# Altium schematic symbol library jlcpcb_2025_04_capacitors_extended_1206.schlib: 2503 symbols (part 14 of 14)
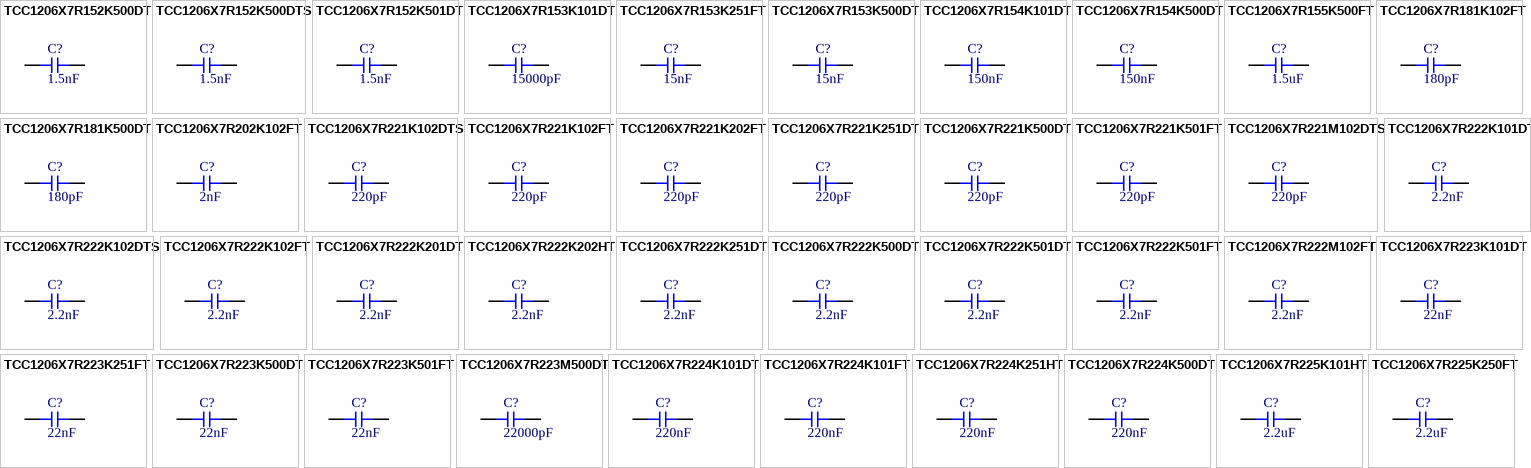
[diagram p75: symbols TCC1206X7R152K500DT to TCC1206X7R225K250FT]

## TCC1206X7R222K251DT
designator C?  Capacitance: 2.2nF  (hidden comment: *)
Capacitor, Ceramic (MLCC), 2.2nF, ±10%, 250V, X7R, ±10%, SMD 1206; Manufacturer: CCTC; Manufacturer Part Number: TCC1206X7R222K251DT; Package Size: 1206; JLCPCB Basic Part: No; JLCPCB Part Number: C377084; Supplier 1: LCSC; Category: Capacitors - MLCC; Supplier Part Number 1: C377084; Tolerance: ±10%; Voltage Rating: 250V; Temperature Coefficient: X7R; RoHS: Yes; ComponentLink1Description: Datasheet; ComponentLink1URL: https://wmsc.lcsc.com/wmsc/upload/file/pdf/v2/lcsc/2304140030_CCTC-TCC1206X7R222K251DT_C377084.pdf; ComponentLink2Description: JLCPCB Part URL; ComponentLink2URL: https://jlcpcb.com/partdetail/C377084; ComponentLink3Description: LCSC Part URL; ComponentLink3URL: https://lcsc.com/product-detail/Multilayer-Ceramic-Capacitors-MLCC---SMD-SMT_CCTC-CCTC-TCC1206X7R222K251DT_C377084.html
footprint CAP-1206 (1206 (3216M) Capacitor)
pins: 1, 2

## TCC1206X7R222K500DT
designator C?  Capacitance: 2.2nF  (hidden comment: *)
Capacitor, Ceramic (MLCC), 2.2nF, ±10%, 50V, X7R, ±10%, SMD 1206; Manufacturer: CCTC; Manufacturer Part Number: TCC1206X7R222K500DT; Package Size: 1206; JLCPCB Basic Part: No; JLCPCB Part Number: C282847; Supplier 1: LCSC; Category: Capacitors - MLCC; Supplier Part Number 1: C282847; Tolerance: ±10%; Voltage Rating: 50V; Temperature Coefficient: X7R; RoHS: Yes; ComponentLink1Description: Datasheet; ComponentLink1URL: https://wmsc.lcsc.com/wmsc/upload/file/pdf/v2/lcsc/2304140030_CCTC-TCC1206X7R222K500DT_C282847.pdf; ComponentLink2Description: JLCPCB Part URL; ComponentLink2URL: https://jlcpcb.com/partdetail/C282847; ComponentLink3Description: LCSC Part URL; ComponentLink3URL: https://lcsc.com/product-detail/Multilayer-Ceramic-Capacitors-MLCC---SMD-SMT_CCTC-CCTC-TCC1206X7R222K500DT_C282847.html
footprint CAP-1206 (1206 (3216M) Capacitor)
pins: 1, 2

## TCC1206X7R222K501DT
designator C?  Capacitance: 2.2nF  (hidden comment: *)
Capacitor, Ceramic (MLCC), 2.2nF, ±10%, 500V, X7R, ±10%, SMD 1206; Manufacturer: CCTC; Manufacturer Part Number: TCC1206X7R222K501DT; Package Size: 1206; JLCPCB Basic Part: No; JLCPCB Part Number: C309044; Supplier 1: LCSC; Category: Capacitors - MLCC; Supplier Part Number 1: C309044; Tolerance: ±10%; Voltage Rating: 500V; Temperature Coefficient: X7R; RoHS: Yes; ComponentLink1Description: Datasheet; ComponentLink1URL: https://wmsc.lcsc.com/wmsc/upload/file/pdf/v2/lcsc/2304140030_CCTC-TCC1206X7R222K501DT_C309044.pdf; ComponentLink2Description: JLCPCB Part URL; ComponentLink2URL: https://jlcpcb.com/partdetail/C309044; ComponentLink3Description: LCSC Part URL; ComponentLink3URL: https://lcsc.com/product-detail/Multilayer-Ceramic-Capacitors-MLCC---SMD-SMT_CCTC-CCTC-TCC1206X7R222K501DT_C309044.html
footprint CAP-1206 (1206 (3216M) Capacitor)
pins: 1, 2

## TCC1206X7R222K501FT
designator C?  Capacitance: 2.2nF  (hidden comment: *)
Capacitor, Ceramic (MLCC), 2.2nF, ±10%, 500V, X7R, ±10%, SMD 1206; Manufacturer: CCTC; Manufacturer Part Number: TCC1206X7R222K501FT; Package Size: 1206; JLCPCB Basic Part: No; JLCPCB Part Number: C377086; Supplier 1: LCSC; Category: Capacitors - MLCC; Supplier Part Number 1: C377086; Tolerance: ±10%; Voltage Rating: 500V; Temperature Coefficient: X7R; RoHS: Yes; ComponentLink1Description: Datasheet; ComponentLink1URL: https://wmsc.lcsc.com/wmsc/upload/file/pdf/v2/lcsc/2304140030_CCTC-TCC1206X7R222K501FT_C377086.pdf; ComponentLink2Description: JLCPCB Part URL; ComponentLink2URL: https://jlcpcb.com/partdetail/C377086; ComponentLink3Description: LCSC Part URL; ComponentLink3URL: https://lcsc.com/product-detail/Multilayer-Ceramic-Capacitors-MLCC---SMD-SMT_CCTC-CCTC-TCC1206X7R222K501FT_C377086.html
footprint CAP-1206 (1206 (3216M) Capacitor)
pins: 1, 2

## TCC1206X7R222M102FT
designator C?  Capacitance: 2.2nF  (hidden comment: *)
Capacitor, Ceramic (MLCC), 2.2nF, ±20%, 1kV, X7R, ±20%, SMD 1206; Manufacturer: CCTC; Manufacturer Part Number: TCC1206X7R222M102FT; Package Size: 1206; JLCPCB Basic Part: No; JLCPCB Part Number: C5448912; Supplier 1: LCSC; Category: Capacitors - MLCC; Supplier Part Number 1: C5448912; Tolerance: ±20%; Voltage Rating: 1kV; Temperature Coefficient: X7R; RoHS: Yes; ComponentLink1Description: Datasheet; ComponentLink1URL: https://wmsc.lcsc.com/wmsc/upload/file/pdf/v2/lcsc/2304251417_CCTC-TCC1206X7R222M102FT_C5448912.pdf; ComponentLink2Description: JLCPCB Part URL; ComponentLink2URL: https://jlcpcb.com/partdetail/C5448912; ComponentLink3Description: LCSC Part URL; ComponentLink3URL: https://lcsc.com/product-detail/Multilayer-Ceramic-Capacitors-MLCC---SMD-SMT_CCTC-CCTC-TCC1206X7R222M102FT_C5448912.html
footprint CAP-1206 (1206 (3216M) Capacitor)
pins: 1, 2

## TCC1206X7R223K101DT
designator C?  Capacitance: 22nF  (hidden comment: *)
Capacitor, Ceramic (MLCC), 22nF, ±10%, 100V, X7R, ±10%, SMD 1206; Manufacturer: CCTC; Manufacturer Part Number: TCC1206X7R223K101DT; Package Size: 1206; JLCPCB Basic Part: No; JLCPCB Part Number: C282848; Supplier 1: LCSC; Category: Capacitors - MLCC; Supplier Part Number 1: C282848; Tolerance: ±10%; Voltage Rating: 100V; Temperature Coefficient: X7R; RoHS: Yes; ComponentLink1Description: Datasheet; ComponentLink1URL: https://wmsc.lcsc.com/wmsc/upload/file/pdf/v2/lcsc/2304140030_CCTC-TCC1206X7R223K101DT_C282848.pdf; ComponentLink2Description: JLCPCB Part URL; ComponentLink2URL: https://jlcpcb.com/partdetail/C282848; ComponentLink3Description: LCSC Part URL; ComponentLink3URL: https://lcsc.com/product-detail/Multilayer-Ceramic-Capacitors-MLCC---SMD-SMT_CCTC-CCTC-TCC1206X7R223K101DT_C282848.html
footprint CAP-1206 (1206 (3216M) Capacitor)
pins: 1, 2

## TCC1206X7R223K251FT
designator C?  Capacitance: 22nF  (hidden comment: *)
Capacitor, Ceramic (MLCC), 22nF, ±10%, 250V, X7R, ±10%, SMD 1206; Manufacturer: CCTC; Manufacturer Part Number: TCC1206X7R223K251FT; Package Size: 1206; JLCPCB Basic Part: No; JLCPCB Part Number: C282849; Supplier 1: LCSC; Category: Capacitors - MLCC; Supplier Part Number 1: C282849; Tolerance: ±10%; Voltage Rating: 250V; Temperature Coefficient: X7R; RoHS: Yes; ComponentLink1Description: Datasheet; ComponentLink1URL: https://wmsc.lcsc.com/wmsc/upload/file/pdf/v2/lcsc/2304140030_CCTC-TCC1206X7R223K251FT_C282849.pdf; ComponentLink2Description: JLCPCB Part URL; ComponentLink2URL: https://jlcpcb.com/partdetail/C282849; ComponentLink3Description: LCSC Part URL; ComponentLink3URL: https://lcsc.com/product-detail/Multilayer-Ceramic-Capacitors-MLCC---SMD-SMT_CCTC-CCTC-TCC1206X7R223K251FT_C282849.html
footprint CAP-1206 (1206 (3216M) Capacitor)
pins: 1, 2

## TCC1206X7R223K500DT
designator C?  Capacitance: 22nF  (hidden comment: *)
Capacitor, Ceramic (MLCC), 22nF, ±10%, 50V, X7R, ±10%, SMD 1206; Manufacturer: CCTC; Manufacturer Part Number: TCC1206X7R223K500DT; Package Size: 1206; JLCPCB Basic Part: No; JLCPCB Part Number: C282850; Supplier 1: LCSC; Category: Capacitors - MLCC; Supplier Part Number 1: C282850; Tolerance: ±10%; Voltage Rating: 50V; Temperature Coefficient: X7R; RoHS: Yes; ComponentLink1Description: Datasheet; ComponentLink1URL: https://wmsc.lcsc.com/wmsc/upload/file/pdf/v2/lcsc/2304140030_CCTC-TCC1206X7R223K500DT_C282850.pdf; ComponentLink2Description: JLCPCB Part URL; ComponentLink2URL: https://jlcpcb.com/partdetail/C282850; ComponentLink3Description: LCSC Part URL; ComponentLink3URL: https://lcsc.com/product-detail/Multilayer-Ceramic-Capacitors-MLCC---SMD-SMT_CCTC-CCTC-TCC1206X7R223K500DT_C282850.html
footprint CAP-1206 (1206 (3216M) Capacitor)
pins: 1, 2

## TCC1206X7R223K501FT
designator C?  Capacitance: 22nF  (hidden comment: *)
Capacitor, Ceramic (MLCC), 22nF, ±10%, 500V, X7R, ±10%, SMD 1206; Manufacturer: CCTC; Manufacturer Part Number: TCC1206X7R223K501FT; Package Size: 1206; JLCPCB Basic Part: No; JLCPCB Part Number: C282851; Supplier 1: LCSC; Category: Capacitors - MLCC; Supplier Part Number 1: C282851; Tolerance: ±10%; Voltage Rating: 500V; Temperature Coefficient: X7R; RoHS: Yes; ComponentLink1Description: Datasheet; ComponentLink1URL: https://wmsc.lcsc.com/wmsc/upload/file/pdf/v2/lcsc/2304140030_CCTC-TCC1206X7R223K501FT_C282851.pdf; ComponentLink2Description: JLCPCB Part URL; ComponentLink2URL: https://jlcpcb.com/partdetail/C282851; ComponentLink3Description: LCSC Part URL; ComponentLink3URL: https://lcsc.com/product-detail/Multilayer-Ceramic-Capacitors-MLCC---SMD-SMT_CCTC-CCTC-TCC1206X7R223K501FT_C282851.html
footprint CAP-1206 (1206 (3216M) Capacitor)
pins: 1, 2

## TCC1206X7R223M500DT
designator C?  Capacitance: 22000pF  (hidden comment: *)
Capacitor, Ceramic (MLCC), 22000pF, ±20%, 50V, X7R, ±20%, SMD 1206; Manufacturer: CCTC; Manufacturer Part Number: TCC1206X7R223M500DT; Package Size: 1206; JLCPCB Basic Part: No; JLCPCB Part Number: C915857; Supplier 1: LCSC; Category: Capacitors - MLCC; Supplier Part Number 1: C915857; Tolerance: ±20%; Voltage Rating: 50V; Temperature Coefficient: X7R; RoHS: Yes; ComponentLink1Description: Datasheet; ComponentLink1URL: https://wmsc.lcsc.com/wmsc/upload/file/pdf/v2/lcsc/2304140030_CCTC-TCC1206X7R223M500DT_C915857.pdf; ComponentLink2Description: JLCPCB Part URL; ComponentLink2URL: https://jlcpcb.com/partdetail/C915857; ComponentLink3Description: LCSC Part URL; ComponentLink3URL: https://lcsc.com/product-detail/Multilayer-Ceramic-Capacitors-MLCC---SMD-SMT_CCTC-CCTC-TCC1206X7R223M500DT_C915857.html
footprint CAP-1206 (1206 (3216M) Capacitor)
pins: 1, 2

## TCC1206X7R224K101DT
designator C?  Capacitance: 220nF  (hidden comment: *)
Capacitor, Ceramic (MLCC), 220nF, ±10%, 100V, X7R, ±10%, SMD 1206; Manufacturer: CCTC; Manufacturer Part Number: TCC1206X7R224K101DT; Package Size: 1206; JLCPCB Basic Part: No; JLCPCB Part Number: C377088; Supplier 1: LCSC; Category: Capacitors - MLCC; Supplier Part Number 1: C377088; Tolerance: ±10%; Voltage Rating: 100V; Temperature Coefficient: X7R; RoHS: Yes; ComponentLink1Description: Datasheet; ComponentLink1URL: https://wmsc.lcsc.com/wmsc/upload/file/pdf/v2/lcsc/2304140030_CCTC-TCC1206X7R224K101DT_C377088.pdf; ComponentLink2Description: JLCPCB Part URL; ComponentLink2URL: https://jlcpcb.com/partdetail/C377088; ComponentLink3Description: LCSC Part URL; ComponentLink3URL: https://lcsc.com/product-detail/Multilayer-Ceramic-Capacitors-MLCC---SMD-SMT_CCTC-CCTC-TCC1206X7R224K101DT_C377088.html
footprint CAP-1206 (1206 (3216M) Capacitor)
pins: 1, 2

## TCC1206X7R224K101FT
designator C?  Capacitance: 220nF  (hidden comment: *)
Capacitor, Ceramic (MLCC), 220nF, ±10%, 100V, X7R, ±10%, SMD 1206; Manufacturer: CCTC; Manufacturer Part Number: TCC1206X7R224K101FT; Package Size: 1206; JLCPCB Basic Part: No; JLCPCB Part Number: C374077; Supplier 1: LCSC; Category: Capacitors - MLCC; Supplier Part Number 1: C374077; Tolerance: ±10%; Voltage Rating: 100V; Temperature Coefficient: X7R; RoHS: Yes; ComponentLink1Description: Datasheet; ComponentLink1URL: https://wmsc.lcsc.com/wmsc/upload/file/pdf/v2/lcsc/2304140030_CCTC-TCC1206X7R224K101FT_C374077.pdf; ComponentLink2Description: JLCPCB Part URL; ComponentLink2URL: https://jlcpcb.com/partdetail/C374077; ComponentLink3Description: LCSC Part URL; ComponentLink3URL: https://lcsc.com/product-detail/Multilayer-Ceramic-Capacitors-MLCC---SMD-SMT_CCTC-CCTC-TCC1206X7R224K101FT_C374077.html
footprint CAP-1206 (1206 (3216M) Capacitor)
pins: 1, 2

## TCC1206X7R224K251HT
designator C?  Capacitance: 220nF  (hidden comment: *)
Capacitor, Ceramic (MLCC), 220nF, ±10%, 250V, X7R, ±10%, SMD 1206; Manufacturer: CCTC; Manufacturer Part Number: TCC1206X7R224K251HT; Package Size: 1206; JLCPCB Basic Part: No; JLCPCB Part Number: C377089; Supplier 1: LCSC; Category: Capacitors - MLCC; Supplier Part Number 1: C377089; Tolerance: ±10%; Voltage Rating: 250V; Temperature Coefficient: X7R; RoHS: Yes; ComponentLink1Description: Datasheet; ComponentLink1URL: https://wmsc.lcsc.com/wmsc/upload/file/pdf/v2/lcsc/2304140030_CCTC-TCC1206X7R224K251HT_C377089.pdf; ComponentLink2Description: JLCPCB Part URL; ComponentLink2URL: https://jlcpcb.com/partdetail/C377089; ComponentLink3Description: LCSC Part URL; ComponentLink3URL: https://lcsc.com/product-detail/Multilayer-Ceramic-Capacitors-MLCC---SMD-SMT_CCTC-CCTC-TCC1206X7R224K251HT_C377089.html
footprint CAP-1206 (1206 (3216M) Capacitor)
pins: 1, 2

## TCC1206X7R224K500DT
designator C?  Capacitance: 220nF  (hidden comment: *)
Capacitor, Ceramic (MLCC), 220nF, ±10%, 50V, X7R, ±10%, SMD 1206; Manufacturer: CCTC; Manufacturer Part Number: TCC1206X7R224K500DT; Package Size: 1206; JLCPCB Basic Part: No; JLCPCB Part Number: C377090; Supplier 1: LCSC; Category: Capacitors - MLCC; Supplier Part Number 1: C377090; Tolerance: ±10%; Voltage Rating: 50V; Temperature Coefficient: X7R; RoHS: Yes; ComponentLink1Description: Datasheet; ComponentLink1URL: https://wmsc.lcsc.com/wmsc/upload/file/pdf/v2/lcsc/2304140030_CCTC-TCC1206X7R224K500DT_C377090.pdf; ComponentLink2Description: JLCPCB Part URL; ComponentLink2URL: https://jlcpcb.com/partdetail/C377090; ComponentLink3Description: LCSC Part URL; ComponentLink3URL: https://lcsc.com/product-detail/Multilayer-Ceramic-Capacitors-MLCC---SMD-SMT_CCTC-CCTC-TCC1206X7R224K500DT_C377090.html
footprint CAP-1206 (1206 (3216M) Capacitor)
pins: 1, 2

## TCC1206X7R225K101HT
designator C?  Capacitance: 2.2uF  (hidden comment: *)
Capacitor, Ceramic (MLCC), 2.2uF, ±10%, 100V, X7R, ±10%, SMD 1206; Manufacturer: CCTC; Manufacturer Part Number: TCC1206X7R225K101HT; Package Size: 1206; JLCPCB Basic Part: No; JLCPCB Part Number: C7393990; Supplier 1: LCSC; Category: Capacitors - MLCC; Supplier Part Number 1: C7393990; Tolerance: ±10%; Voltage Rating: 100V; Temperature Coefficient: X7R; RoHS: Yes; ComponentLink1Description: Datasheet; ComponentLink1URL: https://wmsc.lcsc.com/wmsc/upload/file/pdf/v2/lcsc/2306211528_CCTC-TCC1206X7R225K101HT_C7393990.pdf; ComponentLink2Description: JLCPCB Part URL; ComponentLink2URL: https://jlcpcb.com/partdetail/C7393990; ComponentLink3Description: LCSC Part URL; ComponentLink3URL: https://lcsc.com/product-detail/Multilayer-Ceramic-Capacitors-MLCC---SMD-SMT_CCTC-CCTC-TCC1206X7R225K101HT_C7393990.html
footprint CAP-1206 (1206 (3216M) Capacitor)
pins: 1, 2

## TCC1206X7R225K250FT
designator C?  Capacitance: 2.2uF  (hidden comment: *)
Capacitor, Ceramic (MLCC), 2.2uF, ±10%, 25V, X7R, ±10%, SMD 1206; Manufacturer: CCTC; Manufacturer Part Number: TCC1206X7R225K250FT; Package Size: 1206; JLCPCB Basic Part: No; JLCPCB Part Number: C696854; Supplier 1: LCSC; Category: Capacitors - MLCC; Supplier Part Number 1: C696854; Tolerance: ±10%; Voltage Rating: 25V; Temperature Coefficient: X7R; RoHS: Yes; ComponentLink1Description: Datasheet; ComponentLink1URL: https://wmsc.lcsc.com/wmsc/upload/file/pdf/v2/lcsc/2304140030_CCTC-TCC1206X7R225K250FT_C696854.pdf; ComponentLink2Description: JLCPCB Part URL; ComponentLink2URL: https://jlcpcb.com/partdetail/C696854; ComponentLink3Description: LCSC Part URL; ComponentLink3URL: https://lcsc.com/product-detail/Multilayer-Ceramic-Capacitors-MLCC---SMD-SMT_CCTC-CCTC-TCC1206X7R225K250FT_C696854.html
footprint CAP-1206 (1206 (3216M) Capacitor)
pins: 1, 2

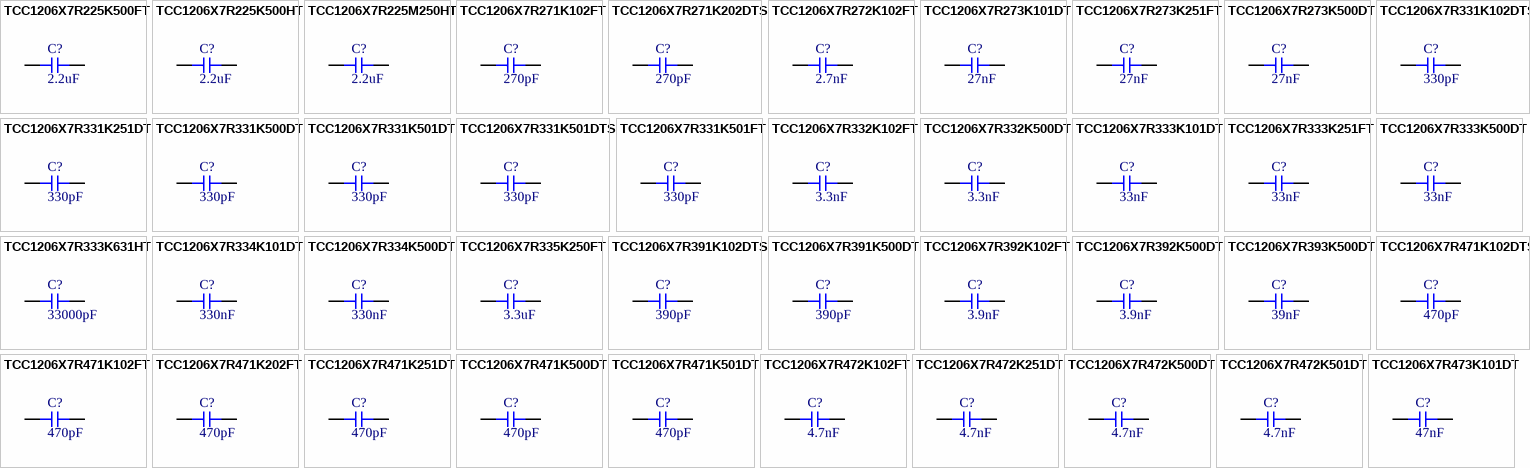
[diagram p60: symbols TCC1206X7R225K500FT to TCC1206X7R473K101DT]

## TCC1206X7R225K500FT
designator C?  Capacitance: 2.2uF  (hidden comment: *)
Capacitor, Ceramic (MLCC), 2.2uF, ±10%, 50V, X7R, ±10%, SMD 1206; Manufacturer: CCTC; Manufacturer Part Number: TCC1206X7R225K500FT; Package Size: 1206; JLCPCB Basic Part: No; JLCPCB Part Number: C282852; Supplier 1: LCSC; Category: Capacitors - MLCC; Supplier Part Number 1: C282852; Tolerance: ±10%; Voltage Rating: 50V; Temperature Coefficient: X7R; RoHS: Yes; ComponentLink1Description: Datasheet; ComponentLink1URL: https://wmsc.lcsc.com/wmsc/upload/file/pdf/v2/lcsc/2304140030_CCTC-TCC1206X7R225K500FT_C282852.pdf; ComponentLink2Description: JLCPCB Part URL; ComponentLink2URL: https://jlcpcb.com/partdetail/C282852; ComponentLink3Description: LCSC Part URL; ComponentLink3URL: https://lcsc.com/product-detail/Multilayer-Ceramic-Capacitors-MLCC---SMD-SMT_CCTC-CCTC-TCC1206X7R225K500FT_C282852.html
footprint CAP-1206 (1206 (3216M) Capacitor)
pins: 1, 2

## TCC1206X7R225K500HT
designator C?  Capacitance: 2.2uF  (hidden comment: *)
Capacitor, Ceramic (MLCC), 2.2uF, ±10%, 50V, X7R, ±10%, SMD 1206; Manufacturer: CCTC; Manufacturer Part Number: TCC1206X7R225K500HT; Package Size: 1206; JLCPCB Basic Part: No; JLCPCB Part Number: C2903669; Supplier 1: LCSC; Category: Capacitors - MLCC; Supplier Part Number 1: C2903669; Tolerance: ±10%; Voltage Rating: 50V; Temperature Coefficient: X7R; RoHS: Yes; ComponentLink1Description: Datasheet; ComponentLink1URL: https://wmsc.lcsc.com/wmsc/upload/file/pdf/v2/lcsc/2110101130_CCTC-TCC1206X7R225K500HT_C2903669.pdf; ComponentLink2Description: JLCPCB Part URL; ComponentLink2URL: https://jlcpcb.com/partdetail/C2903669; ComponentLink3Description: LCSC Part URL; ComponentLink3URL: https://lcsc.com/product-detail/Multilayer-Ceramic-Capacitors-MLCC---SMD-SMT_CCTC-CCTC-TCC1206X7R225K500HT_C2903669.html
footprint CAP-1206 (1206 (3216M) Capacitor)
pins: 1, 2

## TCC1206X7R225M250HT
designator C?  Capacitance: 2.2uF  (hidden comment: *)
Capacitor, Ceramic (MLCC), 2.2uF, ±20%, 25V, X7R, ±20%, SMD 1206; Manufacturer: CCTC; Manufacturer Part Number: TCC1206X7R225M250HT; Package Size: 1206; JLCPCB Basic Part: No; JLCPCB Part Number: C5449010; Supplier 1: LCSC; Category: Capacitors - MLCC; Supplier Part Number 1: C5449010; Tolerance: ±20%; Voltage Rating: 25V; Temperature Coefficient: X7R; RoHS: Yes; ComponentLink1Description: Datasheet; ComponentLink2Description: JLCPCB Part URL; ComponentLink2URL: https://jlcpcb.com/partdetail/C5449010; ComponentLink3Description: LCSC Part URL; ComponentLink3URL: https://lcsc.com/product-detail/Multilayer-Ceramic-Capacitors-MLCC---SMD-SMT_CCTC-CCTC-TCC1206X7R225M250HT_C5449010.html
footprint CAP-1206 (1206 (3216M) Capacitor)
pins: 1, 2

## TCC1206X7R271K102FT
designator C?  Capacitance: 270pF  (hidden comment: *)
Capacitor, Ceramic (MLCC), 270pF, ±10%, 1kV, X7R, ±10%, SMD 1206; Manufacturer: CCTC; Manufacturer Part Number: TCC1206X7R271K102FT; Package Size: 1206; JLCPCB Basic Part: No; JLCPCB Part Number: C282854; Supplier 1: LCSC; Category: Capacitors - MLCC; Supplier Part Number 1: C282854; Tolerance: ±10%; Voltage Rating: 1kV; Temperature Coefficient: X7R; RoHS: Yes; ComponentLink1Description: Datasheet; ComponentLink1URL: https://wmsc.lcsc.com/wmsc/upload/file/pdf/v2/lcsc/2304140030_CCTC-TCC1206X7R271K102FT_C282854.pdf; ComponentLink2Description: JLCPCB Part URL; ComponentLink2URL: https://jlcpcb.com/partdetail/C282854; ComponentLink3Description: LCSC Part URL; ComponentLink3URL: https://lcsc.com/product-detail/Multilayer-Ceramic-Capacitors-MLCC---SMD-SMT_CCTC-CCTC-TCC1206X7R271K102FT_C282854.html
footprint CAP-1206 (1206 (3216M) Capacitor)
pins: 1, 2

## TCC1206X7R271K202DTS
designator C?  Capacitance: 270pF  (hidden comment: *)
Capacitor, Ceramic (MLCC), 270pF, ±10%, 2kV, X7R, ±10%, SMD 1206; Manufacturer: CCTC; Manufacturer Part Number: TCC1206X7R271K202DTS; Package Size: 1206; JLCPCB Basic Part: No; JLCPCB Part Number: C5448965; Supplier 1: LCSC; Category: Capacitors - MLCC; Supplier Part Number 1: C5448965; Tolerance: ±10%; Voltage Rating: 2kV; Temperature Coefficient: X7R; RoHS: Yes; ComponentLink1Description: Datasheet; ComponentLink2Description: JLCPCB Part URL; ComponentLink2URL: https://jlcpcb.com/partdetail/C5448965; ComponentLink3Description: LCSC Part URL; ComponentLink3URL: https://lcsc.com/product-detail/Multilayer-Ceramic-Capacitors-MLCC---SMD-SMT_CCTC-CCTC-TCC1206X7R271K202DTS_C5448965.html
footprint CAP-1206 (1206 (3216M) Capacitor)
pins: 1, 2

## TCC1206X7R272K102FT
designator C?  Capacitance: 2.7nF  (hidden comment: *)
Capacitor, Ceramic (MLCC), 2.7nF, ±10%, 1kV, X7R, ±10%, SMD 1206; Manufacturer: CCTC; Manufacturer Part Number: TCC1206X7R272K102FT; Package Size: 1206; JLCPCB Basic Part: No; JLCPCB Part Number: C282855; Supplier 1: LCSC; Category: Capacitors - MLCC; Supplier Part Number 1: C282855; Tolerance: ±10%; Voltage Rating: 1kV; Temperature Coefficient: X7R; RoHS: Yes; ComponentLink1Description: Datasheet; ComponentLink1URL: https://wmsc.lcsc.com/wmsc/upload/file/pdf/v2/lcsc/2304140030_CCTC-TCC1206X7R272K102FT_C282855.pdf; ComponentLink2Description: JLCPCB Part URL; ComponentLink2URL: https://jlcpcb.com/partdetail/C282855; ComponentLink3Description: LCSC Part URL; ComponentLink3URL: https://lcsc.com/product-detail/Multilayer-Ceramic-Capacitors-MLCC---SMD-SMT_CCTC-CCTC-TCC1206X7R272K102FT_C282855.html
footprint CAP-1206 (1206 (3216M) Capacitor)
pins: 1, 2

## TCC1206X7R273K101DT
designator C?  Capacitance: 27nF  (hidden comment: *)
Capacitor, Ceramic (MLCC), 27nF, ±10%, 100V, X7R, ±10%, SMD 1206; Manufacturer: CCTC; Manufacturer Part Number: TCC1206X7R273K101DT; Package Size: 1206; JLCPCB Basic Part: No; JLCPCB Part Number: C5449019; Supplier 1: LCSC; Category: Capacitors - MLCC; Supplier Part Number 1: C5449019; Tolerance: ±10%; Voltage Rating: 100V; Temperature Coefficient: X7R; RoHS: Yes; ComponentLink1Description: Datasheet; ComponentLink1URL: https://wmsc.lcsc.com/wmsc/upload/file/pdf/v2/lcsc/2403281713_CCTC-TCC1206X7R273K101DT_C5449019.pdf; ComponentLink2Description: JLCPCB Part URL; ComponentLink2URL: https://jlcpcb.com/partdetail/C5449019; ComponentLink3Description: LCSC Part URL; ComponentLink3URL: https://lcsc.com/product-detail/Multilayer-Ceramic-Capacitors-MLCC---SMD-SMT_CCTC-CCTC-TCC1206X7R273K101DT_C5449019.html
footprint CAP-1206 (1206 (3216M) Capacitor)
pins: 1, 2

## TCC1206X7R273K251FT
designator C?  Capacitance: 27nF  (hidden comment: *)
Capacitor, Ceramic (MLCC), 27nF, ±10%, 250V, X7R, ±10%, SMD 1206; Manufacturer: CCTC; Manufacturer Part Number: TCC1206X7R273K251FT; Package Size: 1206; JLCPCB Basic Part: No; JLCPCB Part Number: C282856; Supplier 1: LCSC; Category: Capacitors - MLCC; Supplier Part Number 1: C282856; Tolerance: ±10%; Voltage Rating: 250V; Temperature Coefficient: X7R; RoHS: Yes; ComponentLink1Description: Datasheet; ComponentLink1URL: https://wmsc.lcsc.com/wmsc/upload/file/pdf/v2/lcsc/2304140030_CCTC-TCC1206X7R273K251FT_C282856.pdf; ComponentLink2Description: JLCPCB Part URL; ComponentLink2URL: https://jlcpcb.com/partdetail/C282856; ComponentLink3Description: LCSC Part URL; ComponentLink3URL: https://lcsc.com/product-detail/Multilayer-Ceramic-Capacitors-MLCC---SMD-SMT_CCTC-CCTC-TCC1206X7R273K251FT_C282856.html
footprint CAP-1206 (1206 (3216M) Capacitor)
pins: 1, 2

## TCC1206X7R273K500DT
designator C?  Capacitance: 27nF  (hidden comment: *)
Capacitor, Ceramic (MLCC), 27nF, ±10%, 50V, X7R, ±10%, SMD 1206; Manufacturer: CCTC; Manufacturer Part Number: TCC1206X7R273K500DT; Package Size: 1206; JLCPCB Basic Part: No; JLCPCB Part Number: C5448906; Supplier 1: LCSC; Category: Capacitors - MLCC; Supplier Part Number 1: C5448906; Tolerance: ±10%; Voltage Rating: 50V; Temperature Coefficient: X7R; RoHS: Yes; ComponentLink1Description: Datasheet; ComponentLink1URL: https://wmsc.lcsc.com/wmsc/upload/file/pdf/v2/lcsc/2403281712_CCTC-TCC1206X7R273K500DT_C5448906.pdf; ComponentLink2Description: JLCPCB Part URL; ComponentLink2URL: https://jlcpcb.com/partdetail/C5448906; ComponentLink3Description: LCSC Part URL; ComponentLink3URL: https://lcsc.com/product-detail/Multilayer-Ceramic-Capacitors-MLCC---SMD-SMT_CCTC-CCTC-TCC1206X7R273K500DT_C5448906.html
footprint CAP-1206 (1206 (3216M) Capacitor)
pins: 1, 2

## TCC1206X7R331K102DTS
designator C?  Capacitance: 330pF  (hidden comment: *)
Capacitor, Ceramic (MLCC), 330pF, ±10%, 1kV, X7R, ±10%, SMD 1206; Manufacturer: CCTC; Manufacturer Part Number: TCC1206X7R331K102DTS; Package Size: 1206; JLCPCB Basic Part: No; JLCPCB Part Number: C282857; Supplier 1: LCSC; Category: Capacitors - MLCC; Supplier Part Number 1: C282857; Tolerance: ±10%; Voltage Rating: 1kV; Temperature Coefficient: X7R; RoHS: Yes; ComponentLink1Description: Datasheet; ComponentLink1URL: https://wmsc.lcsc.com/wmsc/upload/file/pdf/v2/lcsc/2304140030_CCTC-TCC1206X7R331K102DTS_C282857.pdf; ComponentLink2Description: JLCPCB Part URL; ComponentLink2URL: https://jlcpcb.com/partdetail/C282857; ComponentLink3Description: LCSC Part URL; ComponentLink3URL: https://lcsc.com/product-detail/Multilayer-Ceramic-Capacitors-MLCC---SMD-SMT_CCTC-CCTC-TCC1206X7R331K102DTS_C282857.html
footprint CAP-1206 (1206 (3216M) Capacitor)
pins: 1, 2

## TCC1206X7R331K251DT
designator C?  Capacitance: 330pF  (hidden comment: *)
Capacitor, Ceramic (MLCC), 330pF, ±10%, 250V, X7R, ±10%, SMD 1206; Manufacturer: CCTC; Manufacturer Part Number: TCC1206X7R331K251DT; Package Size: 1206; JLCPCB Basic Part: No; JLCPCB Part Number: C377091; Supplier 1: LCSC; Category: Capacitors - MLCC; Supplier Part Number 1: C377091; Tolerance: ±10%; Voltage Rating: 250V; Temperature Coefficient: X7R; RoHS: Yes; ComponentLink1Description: Datasheet; ComponentLink1URL: https://wmsc.lcsc.com/wmsc/upload/file/pdf/v2/lcsc/2304140030_CCTC-TCC1206X7R331K251DT_C377091.pdf; ComponentLink2Description: JLCPCB Part URL; ComponentLink2URL: https://jlcpcb.com/partdetail/C377091; ComponentLink3Description: LCSC Part URL; ComponentLink3URL: https://lcsc.com/product-detail/Multilayer-Ceramic-Capacitors-MLCC---SMD-SMT_CCTC-CCTC-TCC1206X7R331K251DT_C377091.html
footprint CAP-1206 (1206 (3216M) Capacitor)
pins: 1, 2

## TCC1206X7R331K500DT
designator C?  Capacitance: 330pF  (hidden comment: *)
Capacitor, Ceramic (MLCC), 330pF, ±10%, 50V, X7R, ±10%, SMD 1206; Manufacturer: CCTC; Manufacturer Part Number: TCC1206X7R331K500DT; Package Size: 1206; JLCPCB Basic Part: No; JLCPCB Part Number: C377092; Supplier 1: LCSC; Category: Capacitors - MLCC; Supplier Part Number 1: C377092; Tolerance: ±10%; Voltage Rating: 50V; Temperature Coefficient: X7R; RoHS: Yes; ComponentLink1Description: Datasheet; ComponentLink1URL: https://wmsc.lcsc.com/wmsc/upload/file/pdf/v2/lcsc/2304140030_CCTC-TCC1206X7R331K500DT_C377092.pdf; ComponentLink2Description: JLCPCB Part URL; ComponentLink2URL: https://jlcpcb.com/partdetail/C377092; ComponentLink3Description: LCSC Part URL; ComponentLink3URL: https://lcsc.com/product-detail/Multilayer-Ceramic-Capacitors-MLCC---SMD-SMT_CCTC-CCTC-TCC1206X7R331K500DT_C377092.html
footprint CAP-1206 (1206 (3216M) Capacitor)
pins: 1, 2

## TCC1206X7R331K501DT
designator C?  Capacitance: 330pF  (hidden comment: *)
Capacitor, Ceramic (MLCC), 330pF, ±10%, 500V, X7R, ±10%, SMD 1206; Manufacturer: CCTC; Manufacturer Part Number: TCC1206X7R331K501DT; Package Size: 1206; JLCPCB Basic Part: No; JLCPCB Part Number: C377093; Supplier 1: LCSC; Category: Capacitors - MLCC; Supplier Part Number 1: C377093; Tolerance: ±10%; Voltage Rating: 500V; Temperature Coefficient: X7R; RoHS: Yes; ComponentLink1Description: Datasheet; ComponentLink1URL: https://wmsc.lcsc.com/wmsc/upload/file/pdf/v2/lcsc/2304140030_CCTC-TCC1206X7R331K501DT_C377093.pdf; ComponentLink2Description: JLCPCB Part URL; ComponentLink2URL: https://jlcpcb.com/partdetail/C377093; ComponentLink3Description: LCSC Part URL; ComponentLink3URL: https://lcsc.com/product-detail/Multilayer-Ceramic-Capacitors-MLCC---SMD-SMT_CCTC-CCTC-TCC1206X7R331K501DT_C377093.html
footprint CAP-1206 (1206 (3216M) Capacitor)
pins: 1, 2

## TCC1206X7R331K501DTS
designator C?  Capacitance: 330pF  (hidden comment: *)
Capacitor, Ceramic (MLCC), 330pF, ±10%, 500V, X7R, ±10%, SMD 1206; Manufacturer: CCTC; Manufacturer Part Number: TCC1206X7R331K501DTS; Package Size: 1206; JLCPCB Basic Part: No; JLCPCB Part Number: C344188; Supplier 1: LCSC; Category: Capacitors - MLCC; Supplier Part Number 1: C344188; Tolerance: ±10%; Voltage Rating: 500V; Temperature Coefficient: X7R; RoHS: Yes; ComponentLink1Description: Datasheet; ComponentLink1URL: https://wmsc.lcsc.com/wmsc/upload/file/pdf/v2/lcsc/2304140030_CCTC-TCC1206X7R331K501DTS_C344188.pdf; ComponentLink2Description: JLCPCB Part URL; ComponentLink2URL: https://jlcpcb.com/partdetail/C344188; ComponentLink3Description: LCSC Part URL; ComponentLink3URL: https://lcsc.com/product-detail/Multilayer-Ceramic-Capacitors-MLCC---SMD-SMT_CCTC-CCTC-TCC1206X7R331K501DTS_C344188.html
footprint CAP-1206 (1206 (3216M) Capacitor)
pins: 1, 2

## TCC1206X7R331K501FT
designator C?  Capacitance: 330pF  (hidden comment: *)
Capacitor, Ceramic (MLCC), 330pF, ±10%, 500V, X7R, ±10%, SMD 1206; Manufacturer: CCTC; Manufacturer Part Number: TCC1206X7R331K501FT; Package Size: 1206; JLCPCB Basic Part: No; JLCPCB Part Number: C377094; Supplier 1: LCSC; Category: Capacitors - MLCC; Supplier Part Number 1: C377094; Tolerance: ±10%; Voltage Rating: 500V; Temperature Coefficient: X7R; RoHS: Yes; ComponentLink1Description: Datasheet; ComponentLink1URL: https://wmsc.lcsc.com/wmsc/upload/file/pdf/v2/lcsc/2304140030_CCTC-TCC1206X7R331K501FT_C377094.pdf; ComponentLink2Description: JLCPCB Part URL; ComponentLink2URL: https://jlcpcb.com/partdetail/C377094; ComponentLink3Description: LCSC Part URL; ComponentLink3URL: https://lcsc.com/product-detail/Multilayer-Ceramic-Capacitors-MLCC---SMD-SMT_CCTC-CCTC-TCC1206X7R331K501FT_C377094.html
footprint CAP-1206 (1206 (3216M) Capacitor)
pins: 1, 2

## TCC1206X7R332K102FT
designator C?  Capacitance: 3.3nF  (hidden comment: *)
Capacitor, Ceramic (MLCC), 3.3nF, ±10%, 1kV, X7R, ±10%, SMD 1206; Manufacturer: CCTC; Manufacturer Part Number: TCC1206X7R332K102FT; Package Size: 1206; JLCPCB Basic Part: No; JLCPCB Part Number: C2932188; Supplier 1: LCSC; Category: Capacitors - MLCC; Supplier Part Number 1: C2932188; Tolerance: ±10%; Voltage Rating: 1kV; Temperature Coefficient: X7R; RoHS: Yes; ComponentLink1Description: Datasheet; ComponentLink1URL: https://wmsc.lcsc.com/wmsc/upload/file/pdf/v2/lcsc/2201121530_CCTC-TCC1206X7R332K102FT_C2932188.pdf; ComponentLink2Description: JLCPCB Part URL; ComponentLink2URL: https://jlcpcb.com/partdetail/C2932188; ComponentLink3Description: LCSC Part URL; ComponentLink3URL: https://lcsc.com/product-detail/Multilayer-Ceramic-Capacitors-MLCC---SMD-SMT_CCTC-CCTC-TCC1206X7R332K102FT_C2932188.html
footprint CAP-1206 (1206 (3216M) Capacitor)
pins: 1, 2

## TCC1206X7R332K500DT
designator C?  Capacitance: 3.3nF  (hidden comment: *)
Capacitor, Ceramic (MLCC), 3.3nF, ±10%, 50V, X7R, ±10%, SMD 1206; Manufacturer: CCTC; Manufacturer Part Number: TCC1206X7R332K500DT; Package Size: 1206; JLCPCB Basic Part: No; JLCPCB Part Number: C282859; Supplier 1: LCSC; Category: Capacitors - MLCC; Supplier Part Number 1: C282859; Tolerance: ±10%; Voltage Rating: 50V; Temperature Coefficient: X7R; RoHS: Yes; ComponentLink1Description: Datasheet; ComponentLink1URL: https://wmsc.lcsc.com/wmsc/upload/file/pdf/v2/lcsc/2304140030_CCTC-TCC1206X7R332K500DT_C282859.pdf; ComponentLink2Description: JLCPCB Part URL; ComponentLink2URL: https://jlcpcb.com/partdetail/C282859; ComponentLink3Description: LCSC Part URL; ComponentLink3URL: https://lcsc.com/product-detail/Multilayer-Ceramic-Capacitors-MLCC---SMD-SMT_CCTC-CCTC-TCC1206X7R332K500DT_C282859.html
footprint CAP-1206 (1206 (3216M) Capacitor)
pins: 1, 2

## TCC1206X7R333K101DT
designator C?  Capacitance: 33nF  (hidden comment: *)
Capacitor, Ceramic (MLCC), 33nF, ±10%, 100V, X7R, ±10%, SMD 1206; Manufacturer: CCTC; Manufacturer Part Number: TCC1206X7R333K101DT; Package Size: 1206; JLCPCB Basic Part: No; JLCPCB Part Number: C309053; Supplier 1: LCSC; Category: Capacitors - MLCC; Supplier Part Number 1: C309053; Tolerance: ±10%; Voltage Rating: 100V; Temperature Coefficient: X7R; RoHS: Yes; ComponentLink1Description: Datasheet; ComponentLink1URL: https://wmsc.lcsc.com/wmsc/upload/file/pdf/v2/lcsc/2304140030_CCTC-TCC1206X7R333K101DT_C309053.pdf; ComponentLink2Description: JLCPCB Part URL; ComponentLink2URL: https://jlcpcb.com/partdetail/C309053; ComponentLink3Description: LCSC Part URL; ComponentLink3URL: https://lcsc.com/product-detail/Multilayer-Ceramic-Capacitors-MLCC---SMD-SMT_CCTC-CCTC-TCC1206X7R333K101DT_C309053.html
footprint CAP-1206 (1206 (3216M) Capacitor)
pins: 1, 2

## TCC1206X7R333K251FT
designator C?  Capacitance: 33nF  (hidden comment: *)
Capacitor, Ceramic (MLCC), 33nF, ±10%, 250V, X7R, ±10%, SMD 1206; Manufacturer: CCTC; Manufacturer Part Number: TCC1206X7R333K251FT; Package Size: 1206; JLCPCB Basic Part: No; JLCPCB Part Number: C282860; Supplier 1: LCSC; Category: Capacitors - MLCC; Supplier Part Number 1: C282860; Tolerance: ±10%; Voltage Rating: 250V; Temperature Coefficient: X7R; RoHS: Yes; ComponentLink1Description: Datasheet; ComponentLink1URL: https://wmsc.lcsc.com/wmsc/upload/file/pdf/v2/lcsc/2304140030_CCTC-TCC1206X7R333K251FT_C282860.pdf; ComponentLink2Description: JLCPCB Part URL; ComponentLink2URL: https://jlcpcb.com/partdetail/C282860; ComponentLink3Description: LCSC Part URL; ComponentLink3URL: https://lcsc.com/product-detail/Multilayer-Ceramic-Capacitors-MLCC---SMD-SMT_CCTC-CCTC-TCC1206X7R333K251FT_C282860.html
footprint CAP-1206 (1206 (3216M) Capacitor)
pins: 1, 2

## TCC1206X7R333K500DT
designator C?  Capacitance: 33nF  (hidden comment: *)
Capacitor, Ceramic (MLCC), 33nF, ±10%, 50V, X7R, ±10%, SMD 1206; Manufacturer: CCTC; Manufacturer Part Number: TCC1206X7R333K500DT; Package Size: 1206; JLCPCB Basic Part: No; JLCPCB Part Number: C309052; Supplier 1: LCSC; Category: Capacitors - MLCC; Supplier Part Number 1: C309052; Tolerance: ±10%; Voltage Rating: 50V; Temperature Coefficient: X7R; RoHS: Yes; ComponentLink1Description: Datasheet; ComponentLink1URL: https://wmsc.lcsc.com/wmsc/upload/file/pdf/v2/lcsc/2304140030_CCTC-TCC1206X7R333K500DT_C309052.pdf; ComponentLink2Description: JLCPCB Part URL; ComponentLink2URL: https://jlcpcb.com/partdetail/C309052; ComponentLink3Description: LCSC Part URL; ComponentLink3URL: https://lcsc.com/product-detail/Multilayer-Ceramic-Capacitors-MLCC---SMD-SMT_CCTC-CCTC-TCC1206X7R333K500DT_C309052.html
footprint CAP-1206 (1206 (3216M) Capacitor)
pins: 1, 2

## TCC1206X7R333K631HT
designator C?  Capacitance: 33000pF  (hidden comment: *)
Capacitor, Ceramic (MLCC), 33000pF, ±10%, 630V, X7R, ±10%, SMD 1206; Manufacturer: CCTC; Manufacturer Part Number: TCC1206X7R333K631HT; Package Size: 1206; JLCPCB Basic Part: No; JLCPCB Part Number: C5449035; Supplier 1: LCSC; Category: Capacitors - MLCC; Supplier Part Number 1: C5449035; Tolerance: ±10%; Voltage Rating: 630V; Temperature Coefficient: X7R; RoHS: Yes; ComponentLink1Description: Datasheet; ComponentLink1URL: https://wmsc.lcsc.com/wmsc/upload/file/pdf/v2/lcsc/2403281714_CCTC-TCC1206X7R333K631HT_C5449035.pdf; ComponentLink2Description: JLCPCB Part URL; ComponentLink2URL: https://jlcpcb.com/partdetail/C5449035; ComponentLink3Description: LCSC Part URL; ComponentLink3URL: https://lcsc.com/product-detail/Multilayer-Ceramic-Capacitors-MLCC---SMD-SMT_CCTC-CCTC-TCC1206X7R333K631HT_C5449035.html
footprint CAP-1206 (1206 (3216M) Capacitor)
pins: 1, 2

## TCC1206X7R334K101DT
designator C?  Capacitance: 330nF  (hidden comment: *)
Capacitor, Ceramic (MLCC), 330nF, ±10%, 100V, X7R, ±10%, SMD 1206; Manufacturer: CCTC; Manufacturer Part Number: TCC1206X7R334K101DT; Package Size: 1206; JLCPCB Basic Part: No; JLCPCB Part Number: C2932189; Supplier 1: LCSC; Category: Capacitors - MLCC; Supplier Part Number 1: C2932189; Tolerance: ±10%; Voltage Rating: 100V; Temperature Coefficient: X7R; RoHS: Yes; ComponentLink1Description: Datasheet; ComponentLink1URL: https://wmsc.lcsc.com/wmsc/upload/file/pdf/v2/lcsc/2201121530_CCTC-TCC1206X7R334K101DT_C2932189.pdf; ComponentLink2Description: JLCPCB Part URL; ComponentLink2URL: https://jlcpcb.com/partdetail/C2932189; ComponentLink3Description: LCSC Part URL; ComponentLink3URL: https://lcsc.com/product-detail/Multilayer-Ceramic-Capacitors-MLCC---SMD-SMT_CCTC-CCTC-TCC1206X7R334K101DT_C2932189.html
footprint CAP-1206 (1206 (3216M) Capacitor)
pins: 1, 2
